# Altium integrated library Wurth Electronik Socket Header 6130xx11821.IntLib: 197 symbols (part 1 of 2)
Pins are listed as number, name and electrical type; pins without a type are passive.

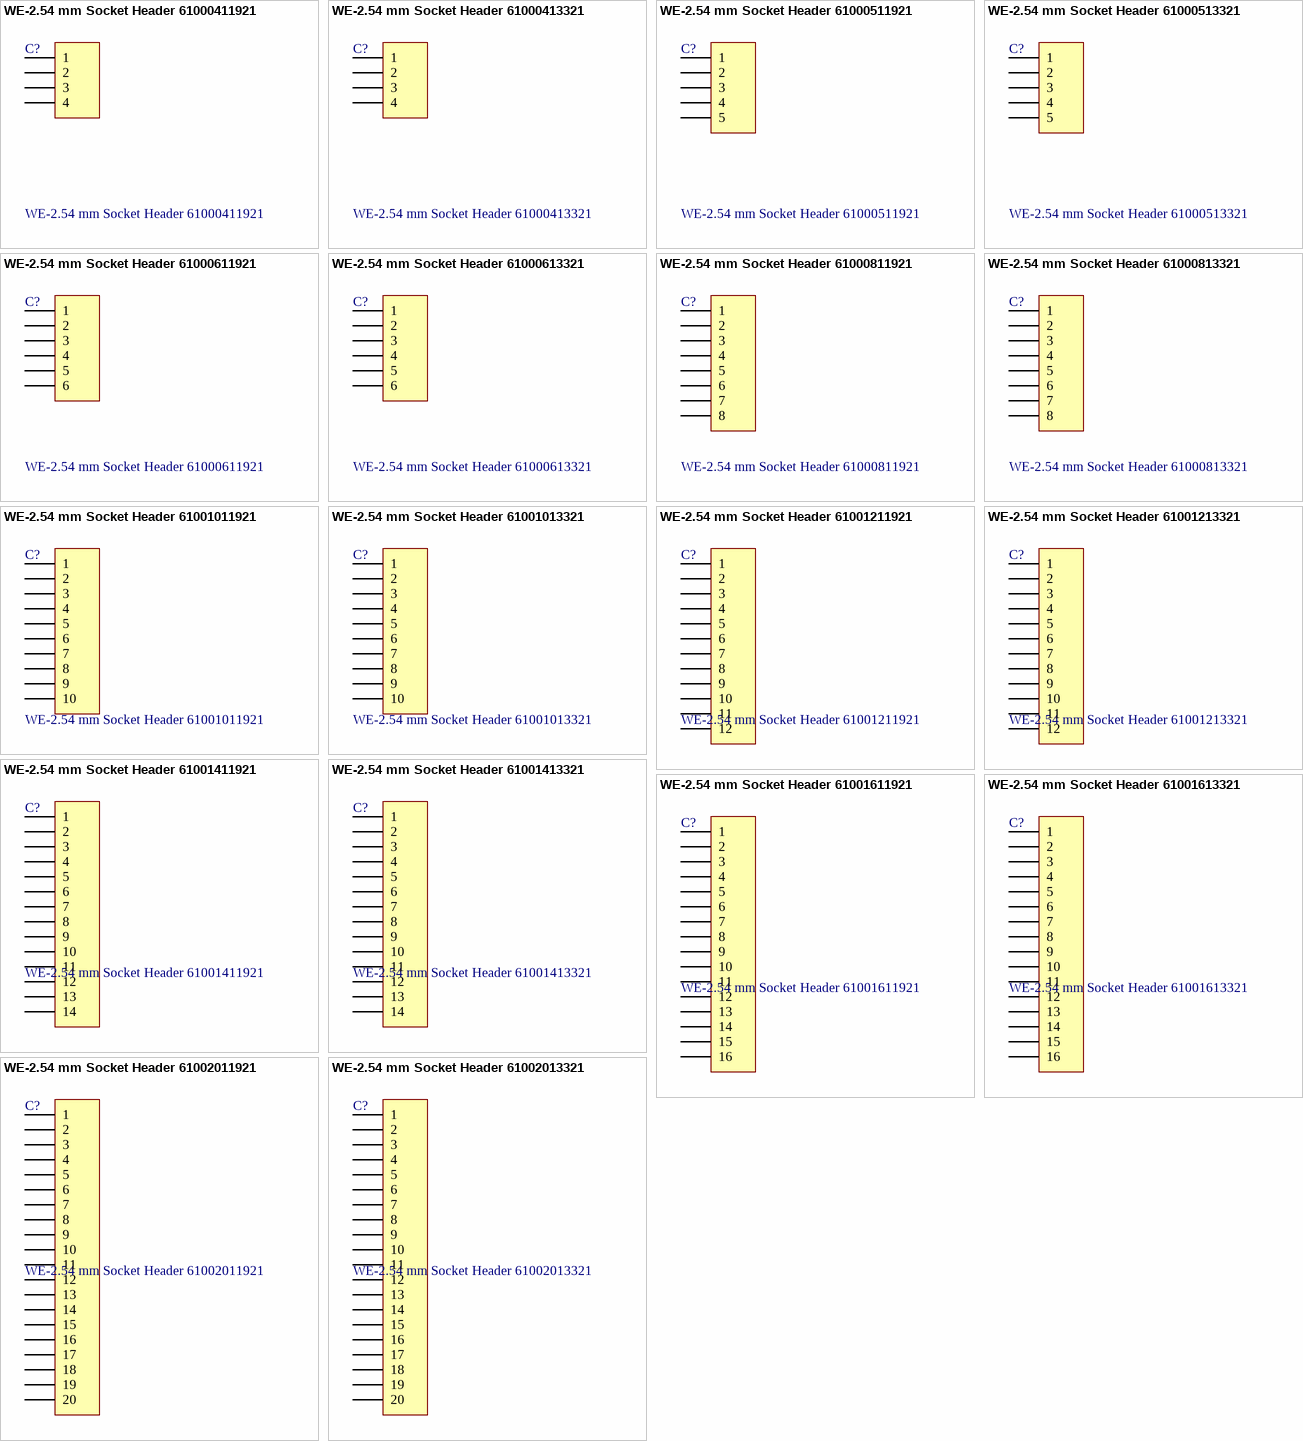
[diagram p0: symbols WE-2.54 mm Socket Header 61000411921 to WE-2.54 mm Socket Header 61002013321]

## WE-2.54 mm Socket Header 61000411921
designator C?
WR-PHD 2.54 mm SMT Socket Header; Manufacturer: Würth Elektronik eiSos GmbH; ComponentLink1 Description: Manufacturer; ComponentLink2 Description: Datasheet; NoPins: 4; Created Date: 29 March 2013; partNo: 61000411921; ComponentLink1URL: http://www.we-online.com; ComponentLink2URL: http://katalog.we-online.de/em/datasheet/6100xx11921.pdf; Created by: Karrer Zheng
footprint 61000411921 (4 pins, 1 row, straight, Type 1, gold plating)
pins: 1, 2, 3, 4

## WE-2.54 mm Socket Header 61000413321
designator C?
WR-PHD 2.54 mm SMT Socket Header; Manufacturer: Würth Elektronik eiSos GmbH; ComponentLink1 Description: Manufacturer; ComponentLink2 Description: Datasheet; NoPins: 4; Created Date: 29 March 2013; partNo: 61000413321; ComponentLink1URL: http://www.we-online.com; ComponentLink2URL: http://katalog.we-online.de/em/datasheet/6100xx11921.pdf; Created by: Karrer Zheng
footprint 61000413321 (4 pins, 1 row, straight, Type 2, gold plating)
pins: 1, 2, 3, 4

## WE-2.54 mm Socket Header 61000511921
designator C?
WR-PHD 2.54 mm SMT Socket Header; Manufacturer: Würth Elektronik eiSos GmbH; ComponentLink1 Description: Manufacturer; ComponentLink2 Description: Datasheet; NoPins: 5; Created Date: 29 March 2013; partNo: 61000511921; ComponentLink1URL: http://www.we-online.com; ComponentLink2URL: http://katalog.we-online.de/em/datasheet/6100xx11921.pdf; Created by: Karrer Zheng
footprint 61000511921 (5 pins, 1 row, straight, Type 1, gold plating)
pins: 1, 2, 3, 4, 5

## WE-2.54 mm Socket Header 61000513321
designator C?
WR-PHD 2.54 mm SMT Socket Header; Manufacturer: Würth Elektronik eiSos GmbH; ComponentLink1 Description: Manufacturer; ComponentLink2 Description: Datasheet; NoPins: 5; Created Date: 29 March 2013; partNo: 61000513321; ComponentLink1URL: http://www.we-online.com; ComponentLink2URL: http://katalog.we-online.de/em/datasheet/6100xx11921.pdf; Created by: Karrer Zheng
footprint 61000513321 (5 pins, 1 row, straight, Type 2, gold plating)
pins: 1, 2, 3, 4, 5

## WE-2.54 mm Socket Header 61000611921
designator C?
WR-PHD 2.54 mm SMT Socket Header; Manufacturer: Würth Elektronik eiSos GmbH; ComponentLink1 Description: Manufacturer; ComponentLink2 Description: Datasheet; NoPins: 6; Created Date: 29 March 2013; partNo: 61000611921; ComponentLink1URL: http://www.we-online.com; ComponentLink2URL: http://katalog.we-online.de/em/datasheet/6100xx11921.pdf; Created by: Karrer Zheng
footprint 61000611921 (6 pins, 1 row, straight, Type 1, gold plating)
pins: 1, 2, 3, 4, 5, 6

## WE-2.54 mm Socket Header 61000613321
designator C?
WR-PHD 2.54 mm SMT Socket Header; Manufacturer: Würth Elektronik eiSos GmbH; ComponentLink1 Description: Manufacturer; ComponentLink2 Description: Datasheet; NoPins: 6; Created Date: 29 March 2013; partNo: 61000613321; ComponentLink1URL: http://www.we-online.com; ComponentLink2URL: http://katalog.we-online.de/em/datasheet/6100xx11921.pdf; Created by: Karrer Zheng
footprint 61000613321 (6 pins, 1 row, straight, Type 2, gold plating)
pins: 1, 2, 3, 4, 5, 6

## WE-2.54 mm Socket Header 61000811921
designator C?
WR-PHD 2.54 mm SMT Socket Header; Manufacturer: Würth Elektronik eiSos GmbH; ComponentLink1 Description: Manufacturer; ComponentLink2 Description: Datasheet; NoPins: 8; Created Date: 29 March 2013; partNo: 61000811921; ComponentLink1URL: http://www.we-online.com; ComponentLink2URL: http://katalog.we-online.de/em/datasheet/6100xx11921.pdf; Created by: Karrer Zheng
footprint 61000811921 (8 pins, 1 row, straight, Type 1, gold plating)
pins: 1, 2, 3, 4, 5, 6, 7, 8

## WE-2.54 mm Socket Header 61000813321
designator C?
WR-PHD 2.54 mm SMT Socket Header; Manufacturer: Würth Elektronik eiSos GmbH; ComponentLink1 Description: Manufacturer; ComponentLink2 Description: Datasheet; NoPins: 8; Created Date: 29 March 2013; partNo: 61000813321; ComponentLink1URL: http://www.we-online.com; ComponentLink2URL: http://katalog.we-online.de/em/datasheet/6100xx11921.pdf; Created by: Karrer Zheng
footprint 61000813321 (8 pins, 1 row, straight, Type 2, gold plating)
pins: 1, 2, 3, 4, 5, 6, 7, 8

## WE-2.54 mm Socket Header 61001011921
designator C?
WR-PHD 2.54 mm SMT Socket Header; Manufacturer: Würth Elektronik eiSos GmbH; ComponentLink1 Description: Manufacturer; ComponentLink2 Description: Datasheet; NoPins: 10; Created Date: 29 March 2013; partNo: 61001011921; ComponentLink1URL: http://www.we-online.com; ComponentLink2URL: http://katalog.we-online.de/em/datasheet/6100xx11921.pdf; Created by: Karrer Zheng
footprint 61001011921 (10 pins, 1 row, straight, Type 1, gold plating)
pins: 1, 2, 3, 4, 5, 6, 7, 8, 9, 10

## WE-2.54 mm Socket Header 61001013321
designator C?
WR-PHD 2.54 mm SMT Socket Header; Manufacturer: Würth Elektronik eiSos GmbH; ComponentLink1 Description: Manufacturer; ComponentLink2 Description: Datasheet; NoPins: 10; Created Date: 29 March 2013; partNo: 61001013321; ComponentLink1URL: http://www.we-online.com; ComponentLink2URL: http://katalog.we-online.de/em/datasheet/6100xx11921.pdf; Created by: Karrer Zheng
footprint 61001013321 (10 pins, 1 row, straight, Type 2, gold plating)
pins: 1, 2, 3, 4, 5, 6, 7, 8, 9, 10

## WE-2.54 mm Socket Header 61001211921
designator C?
WR-PHD 2.54 mm SMT Socket Header; Manufacturer: Würth Elektronik eiSos GmbH; ComponentLink1 Description: Manufacturer; ComponentLink2 Description: Datasheet; NoPins: 12; Created Date: 29 March 2013; partNo: 61001211921; ComponentLink1URL: http://www.we-online.com; ComponentLink2URL: http://katalog.we-online.de/em/datasheet/6100xx11921.pdf; Created by: Karrer Zheng
footprint 61001211921 (12 pins, 1 row, straight, Type 1, gold plating)
pins: 1, 2, 3, 4, 5, 6, 7, 8, 9, 10, 11, 12

## WE-2.54 mm Socket Header 61001213321
designator C?
WR-PHD 2.54 mm SMT Socket Header; Manufacturer: Würth Elektronik eiSos GmbH; ComponentLink1 Description: Manufacturer; ComponentLink2 Description: Datasheet; NoPins: 12; Created Date: 29 March 2013; partNo: 61001213321; ComponentLink1URL: http://www.we-online.com; ComponentLink2URL: http://katalog.we-online.de/em/datasheet/6100xx11921.pdf; Created by: Karrer Zheng
footprint 61001213321 (12 pins, 1 row, straight, Type 2, gold plating)
pins: 1, 2, 3, 4, 5, 6, 7, 8, 9, 10, 11, 12

## WE-2.54 mm Socket Header 61001411921
designator C?
WR-PHD 2.54 mm SMT Socket Header; Manufacturer: Würth Elektronik eiSos GmbH; ComponentLink1 Description: Manufacturer; ComponentLink2 Description: Datasheet; NoPins: 14; Created Date: 29 March 2013; partNo: 61001411921; ComponentLink1URL: http://www.we-online.com; ComponentLink2URL: http://katalog.we-online.de/em/datasheet/6100xx11921.pdf; Created by: Karrer Zheng
footprint 61001411921 (14 pins, 1 row, straight, Type 1, gold plating)
pins: 1, 2, 3, 4, 5, 6, 7, 8, 9, 10, 11, 12, 13, 14

## WE-2.54 mm Socket Header 61001413321
designator C?
WR-PHD 2.54 mm SMT Socket Header; Manufacturer: Würth Elektronik eiSos GmbH; ComponentLink1 Description: Manufacturer; ComponentLink2 Description: Datasheet; NoPins: 14; Created Date: 29 March 2013; partNo: 61001413321; ComponentLink1URL: http://www.we-online.com; ComponentLink2URL: http://katalog.we-online.de/em/datasheet/6100xx11921.pdf; Created by: Karrer Zheng
footprint 61001413321 (14 pins, 1 row, straight, Type 2, gold plating)
pins: 1, 2, 3, 4, 5, 6, 7, 8, 9, 10, 11, 12, 13, 14

## WE-2.54 mm Socket Header 61001611921
designator C?
WR-PHD 2.54 mm SMT Socket Header; Manufacturer: Würth Elektronik eiSos GmbH; ComponentLink1 Description: Manufacturer; ComponentLink2 Description: Datasheet; NoPins: 16; Created Date: 29 March 2013; partNo: 61001611921; ComponentLink1URL: http://www.we-online.com; ComponentLink2URL: http://katalog.we-online.de/em/datasheet/6100xx11921.pdf; Created by: Karrer Zheng
footprint 61001611921 (16 pins, 1 row, straight, Type 1, gold plating)
pins: 1, 2, 3, 4, 5, 6, 7, 8, 9, 10, 11, 12, 13, 14, 15, 16

## WE-2.54 mm Socket Header 61001613321
designator C?
WR-PHD 2.54 mm SMT Socket Header; Manufacturer: Würth Elektronik eiSos GmbH; ComponentLink1 Description: Manufacturer; ComponentLink2 Description: Datasheet; NoPins: 16; Created Date: 29 March 2013; partNo: 61001613321; ComponentLink1URL: http://www.we-online.com; ComponentLink2URL: http://katalog.we-online.de/em/datasheet/6100xx11921.pdf; Created by: Karrer Zheng
footprint 61001613321 (16 pins, 1 row, straight, Type 2, gold plating)
pins: 1, 2, 3, 4, 5, 6, 7, 8, 9, 10, 11, 12, 13, 14, 15, 16

## WE-2.54 mm Socket Header 61002011921
designator C?
WR-PHD 2.54 mm SMT Socket Header; Manufacturer: Würth Elektronik eiSos GmbH; ComponentLink1 Description: Manufacturer; ComponentLink2 Description: Datasheet; NoPins: 20; Created Date: 29 March 2013; partNo: 61002011921; ComponentLink1URL: http://www.we-online.com; ComponentLink2URL: http://katalog.we-online.de/em/datasheet/6100xx11921.pdf; Created by: Karrer Zheng
footprint 61002011921 (20 pins, 1 row, straight, Type 1, gold plating)
pins: 1, 2, 3, 4, 5, 6, 7, 8, 9, 10, 11, 12, 13, 14, 15, 16, 17, 18, 19, 20

## WE-2.54 mm Socket Header 61002013321
designator C?
WR-PHD 2.54 mm SMT Socket Header; Manufacturer: Würth Elektronik eiSos GmbH; ComponentLink1 Description: Manufacturer; ComponentLink2 Description: Datasheet; NoPins: 20; Created Date: 29 March 2013; partNo: 61002013321; ComponentLink1URL: http://www.we-online.com; ComponentLink2URL: http://katalog.we-online.de/em/datasheet/6100xx11921.pdf; Created by: Karrer Zheng
footprint 61002013321 (20 pins, 1 row, straight, Type 2, gold plating)
pins: 1, 2, 3, 4, 5, 6, 7, 8, 9, 10, 11, 12, 13, 14, 15, 16, 17, 18, 19, 20


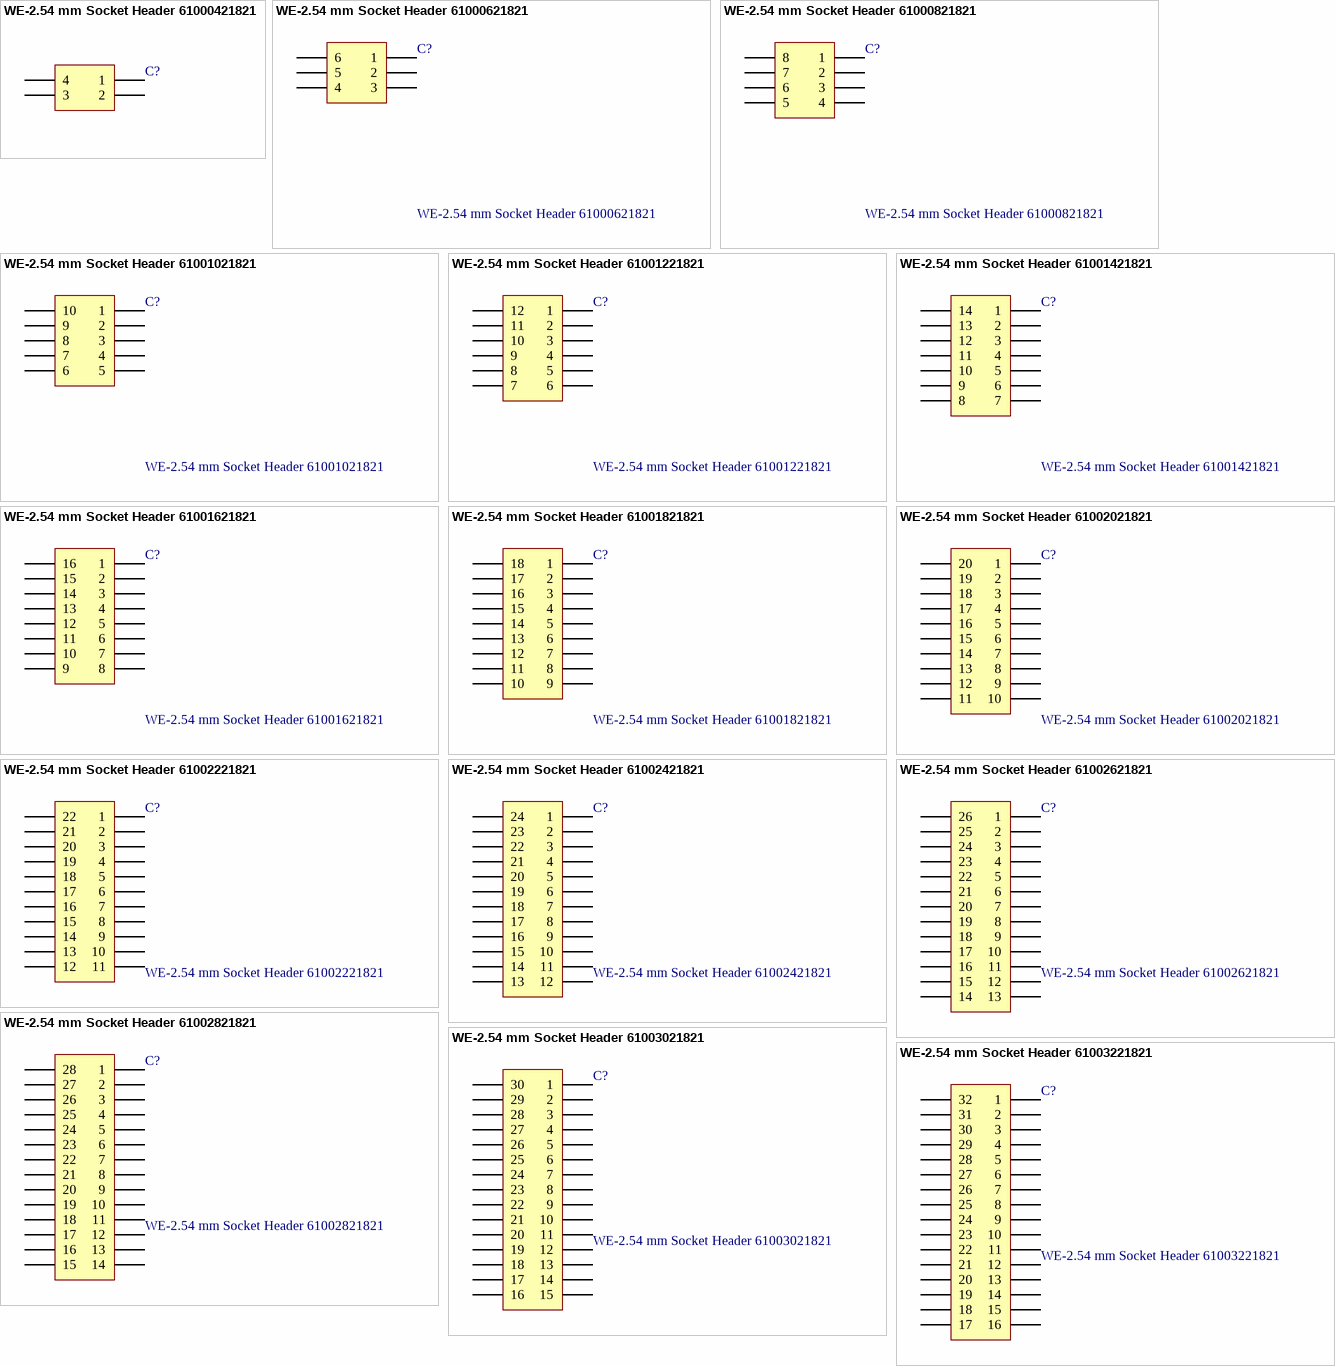
[diagram p1: symbols WE-2.54 mm Socket Header 61000421821 to WE-2.54 mm Socket Header 61003221821]

## WE-2.54 mm Socket Header 61000421821
designator C?
WR-PHD 2.54 mm Dual SMT Socket Header; Manufacturer: Würth Elektronik eiSos GmbH; ComponentLink1 Description: Manufacturer; ComponentLink2 Description: Datasheet; NoPins: 04; Created Date: 29 March 2013; partNo: 61000421821; ComponentLink1URL: http://www.we-online.com; ComponentLink2URL: http://katalog.we-online.de/em/datasheet/6100xx21821.pdf; Created by: Karrer Zheng
footprint 61000421821 (4 pins, dual row, straight, gold plating)
pins: 1, 2, 3, 4

## WE-2.54 mm Socket Header 61000621821
designator C?
WR-PHD 2.54 mm Dual SMT Socket Header; Manufacturer: Würth Elektronik eiSos GmbH; ComponentLink1 Description: Manufacturer; ComponentLink2 Description: Datasheet; NoPins: 06; Created Date: 29 March 2013; partNo: 61000621821; ComponentLink1URL: http://www.we-online.com; ComponentLink2URL: http://katalog.we-online.de/em/datasheet/6100xx21821.pdf; Created by: Karrer Zheng
footprint 61000621821 (6 pins, dual row, straight, gold plating)
pins: 1, 2, 3, 4, 5, 6

## WE-2.54 mm Socket Header 61000821821
designator C?
WR-PHD 2.54 mm Dual SMT Socket Header; Manufacturer: Würth Elektronik eiSos GmbH; ComponentLink1 Description: Manufacturer; ComponentLink2 Description: Datasheet; NoPins: 08; Created Date: 29 March 2013; partNo: 61000821821; ComponentLink1URL: http://www.we-online.com; ComponentLink2URL: http://katalog.we-online.de/em/datasheet/6100xx21821.pdf; Created by: Karrer Zheng
footprint 61000821821 (8 pins, dual row, straight, gold plating)
pins: 1, 2, 3, 4, 5, 6, 7, 8

## WE-2.54 mm Socket Header 61001021821
designator C?
WR-PHD 2.54 mm Dual SMT Socket Header; Manufacturer: Würth Elektronik eiSos GmbH; ComponentLink1 Description: Manufacturer; ComponentLink2 Description: Datasheet; NoPins: 10; Created Date: 29 March 2013; partNo: 61001021821; ComponentLink1URL: http://www.we-online.com; ComponentLink2URL: http://katalog.we-online.de/em/datasheet/6100xx21821.pdf; Created by: Karrer Zheng
footprint 61001021821 (10 pins, dual row, straight, gold plating)
pins: 1, 2, 3, 4, 5, 6, 7, 8, 9, 10

## WE-2.54 mm Socket Header 61001221821
designator C?
WR-PHD 2.54 mm Dual SMT Socket Header; Manufacturer: Würth Elektronik eiSos GmbH; ComponentLink1 Description: Manufacturer; ComponentLink2 Description: Datasheet; NoPins: 12; Created Date: 29 March 2013; partNo: 61001221821; ComponentLink1URL: http://www.we-online.com; ComponentLink2URL: http://katalog.we-online.de/em/datasheet/6100xx21821.pdf; Created by: Karrer Zheng
footprint 61001221821 (12 pins, dual row, straight, gold plating)
pins: 1, 2, 3, 4, 5, 6, 7, 8, 9, 10, 11, 12

## WE-2.54 mm Socket Header 61001421821
designator C?
WR-PHD 2.54 mm Dual SMT Socket Header; Manufacturer: Würth Elektronik eiSos GmbH; ComponentLink1 Description: Manufacturer; ComponentLink2 Description: Datasheet; NoPins: 14; Created Date: 29 March 2013; partNo: 61001421821; ComponentLink1URL: http://www.we-online.com; ComponentLink2URL: http://katalog.we-online.de/em/datasheet/6100xx21821.pdf; Created by: Karrer Zheng
footprint 61001421821 (14 pins, dual row, straight, gold plating)
pins: 1, 2, 3, 4, 5, 6, 7, 8, 9, 10, 11, 12, 13, 14

## WE-2.54 mm Socket Header 61001621821
designator C?
WR-PHD 2.54 mm Dual SMT Socket Header; Manufacturer: Würth Elektronik eiSos GmbH; ComponentLink1 Description: Manufacturer; ComponentLink2 Description: Datasheet; NoPins: 16; Created Date: 29 March 2013; partNo: 61001621821; ComponentLink1URL: http://www.we-online.com; ComponentLink2URL: http://katalog.we-online.de/em/datasheet/6100xx21821.pdf; Created by: Karrer Zheng
footprint 61001621821 (16 pins, dual row, straight, gold plating)
pins: 1, 2, 3, 4, 5, 6, 7, 8, 9, 10, 11, 12, 13, 14, 15, 16

## WE-2.54 mm Socket Header 61001821821
designator C?
WR-PHD 2.54 mm Dual SMT Socket Header; Manufacturer: Würth Elektronik eiSos GmbH; ComponentLink1 Description: Manufacturer; ComponentLink2 Description: Datasheet; NoPins: 18; Created Date: 29 March 2013; partNo: 61001821821; ComponentLink1URL: http://www.we-online.com; ComponentLink2URL: http://katalog.we-online.de/em/datasheet/6100xx21821.pdf; Created by: Karrer Zheng
footprint 61001821821 (18 pins, dual row, straight, gold plating)
pins: 1, 2, 3, 4, 5, 6, 7, 8, 9, 10, 11, 12, 13, 14, 15, 16, 17, 18

## WE-2.54 mm Socket Header 61002021821
designator C?
WR-PHD 2.54 mm Dual SMT Socket Header; Manufacturer: Würth Elektronik eiSos GmbH; ComponentLink1 Description: Manufacturer; ComponentLink2 Description: Datasheet; NoPins: 20; Created Date: 29 March 2013; partNo: 61002021821; ComponentLink1URL: http://www.we-online.com; ComponentLink2URL: http://katalog.we-online.de/em/datasheet/6100xx21821.pdf; Created by: Karrer Zheng
footprint 61002021821 (20 pins, dual row, straight, gold plating)
pins: 1, 2, 3, 4, 5, 6, 7, 8, 9, 10, 11, 12, 13, 14, 15, 16, 17, 18, 19, 20

## WE-2.54 mm Socket Header 61002221821
designator C?
WR-PHD 2.54 mm Dual SMT Socket Header; Manufacturer: Würth Elektronik eiSos GmbH; ComponentLink1 Description: Manufacturer; ComponentLink2 Description: Datasheet; NoPins: 22; Created Date: 29 March 2013; partNo: 61002221821; ComponentLink1URL: http://www.we-online.com; ComponentLink2URL: http://katalog.we-online.de/em/datasheet/6100xx21821.pdf; Created by: Karrer Zheng
footprint 61002221821 (22 pins, dual row, straight, gold plating)
pins: 1, 2, 3, 4, 5, 6, 7, 8, 9, 10, 11, 12, 13, 14, 15, 16, 17, 18, 19, 20, 21, 22

## WE-2.54 mm Socket Header 61002421821
designator C?
WR-PHD 2.54 mm Dual SMT Socket Header; Manufacturer: Würth Elektronik eiSos GmbH; ComponentLink1 Description: Manufacturer; ComponentLink2 Description: Datasheet; NoPins: 24; Created Date: 29 March 2013; partNo: 61002421821; ComponentLink1URL: http://www.we-online.com; ComponentLink2URL: http://katalog.we-online.de/em/datasheet/6100xx21821.pdf; Created by: Karrer Zheng
footprint 61002421821 (24 pins, dual row, straight, gold plating)
pins: 1, 2, 3, 4, 5, 6, 7, 8, 9, 10, 11, 12, 13, 14, 15, 16, 17, 18, 19, 20, 21, 22, 23, 24

## WE-2.54 mm Socket Header 61002621821
designator C?
WR-PHD 2.54 mm Dual SMT Socket Header; Manufacturer: Würth Elektronik eiSos GmbH; ComponentLink1 Description: Manufacturer; ComponentLink2 Description: Datasheet; NoPins: 26; Created Date: 29 March 2013; partNo: 61002621821; ComponentLink1URL: http://www.we-online.com; ComponentLink2URL: http://katalog.we-online.de/em/datasheet/6100xx21821.pdf; Created by: Karrer Zheng
footprint 61002621821 (26 pins, dual row, straight, gold plating)
pins: 1, 2, 3, 4, 5, 6, 7, 8, 9, 10, 11, 12, 13, 14, 15, 16, 17, 18, 19, 20, 21, 22, 23, 24, 25, 26

## WE-2.54 mm Socket Header 61002821821
designator C?
WR-PHD 2.54 mm Dual SMT Socket Header; Manufacturer: Würth Elektronik eiSos GmbH; ComponentLink1 Description: Manufacturer; ComponentLink2 Description: Datasheet; NoPins: 28; Created Date: 29 March 2013; partNo: 61002821821; ComponentLink1URL: http://www.we-online.com; ComponentLink2URL: http://katalog.we-online.de/em/datasheet/6100xx21821.pdf; Created by: Karrer Zheng
footprint 61002821821 (28 pins, dual row, straight, gold plating)
pins: 1, 2, 3, 4, 5, 6, 7, 8, 9, 10, 11, 12, 13, 14, 15, 16, 17, 18, 19, 20, 21, 22, 23, 24, 25, 26, 27, 28

## WE-2.54 mm Socket Header 61003021821
designator C?
WR-PHD 2.54 mm Dual SMT Socket Header; Manufacturer: Würth Elektronik eiSos GmbH; ComponentLink1 Description: Manufacturer; ComponentLink2 Description: Datasheet; NoPins: 30; Created Date: 29 March 2013; partNo: 61003021821; ComponentLink1URL: http://www.we-online.com; ComponentLink2URL: http://katalog.we-online.de/em/datasheet/6100xx21821.pdf; Created by: Karrer Zheng
footprint 61003021821 (30 pins, dual row, straight, gold plating)
pins: 1, 2, 3, 4, 5, 6, 7, 8, 9, 10, 11, 12, 13, 14, 15, 16, 17, 18, 19, 20, 21, 22, 23, 24, 25, 26, 27, 28, 29, 30

## WE-2.54 mm Socket Header 61003221821
designator C?
WR-PHD 2.54 mm Dual SMT Socket Header; Manufacturer: Würth Elektronik eiSos GmbH; ComponentLink1 Description: Manufacturer; ComponentLink2 Description: Datasheet; NoPins: 32; Created Date: 29 March 2013; partNo: 61003221821; ComponentLink1URL: http://www.we-online.com; ComponentLink2URL: http://katalog.we-online.de/em/datasheet/6100xx21821.pdf; Created by: Karrer Zheng
footprint 61003221821 (32 pins, dual row, straight, gold plating)
pins: 1, 2, 3, 4, 5, 6, 7, 8, 9, 10, 11, 12, 13, 14, 15, 16, 17, 18, 19, 20, 21, 22, 23, 24, 25, 26, 27, 28, 29, 30, 31, 32
